# Altium footprint library Library.PcbLib: 144 footprints (part 2 of 9)
Each footprint in its own frame and in the unit in brackets; x right, y up, seen from the top. Pads: shape width x height; smd on the part's side, far side on the other; paste and mask are expansions set on the pad; w line width, h text height; cw(c..) or ccw(c..) is an arc to the next point about the centre after c.
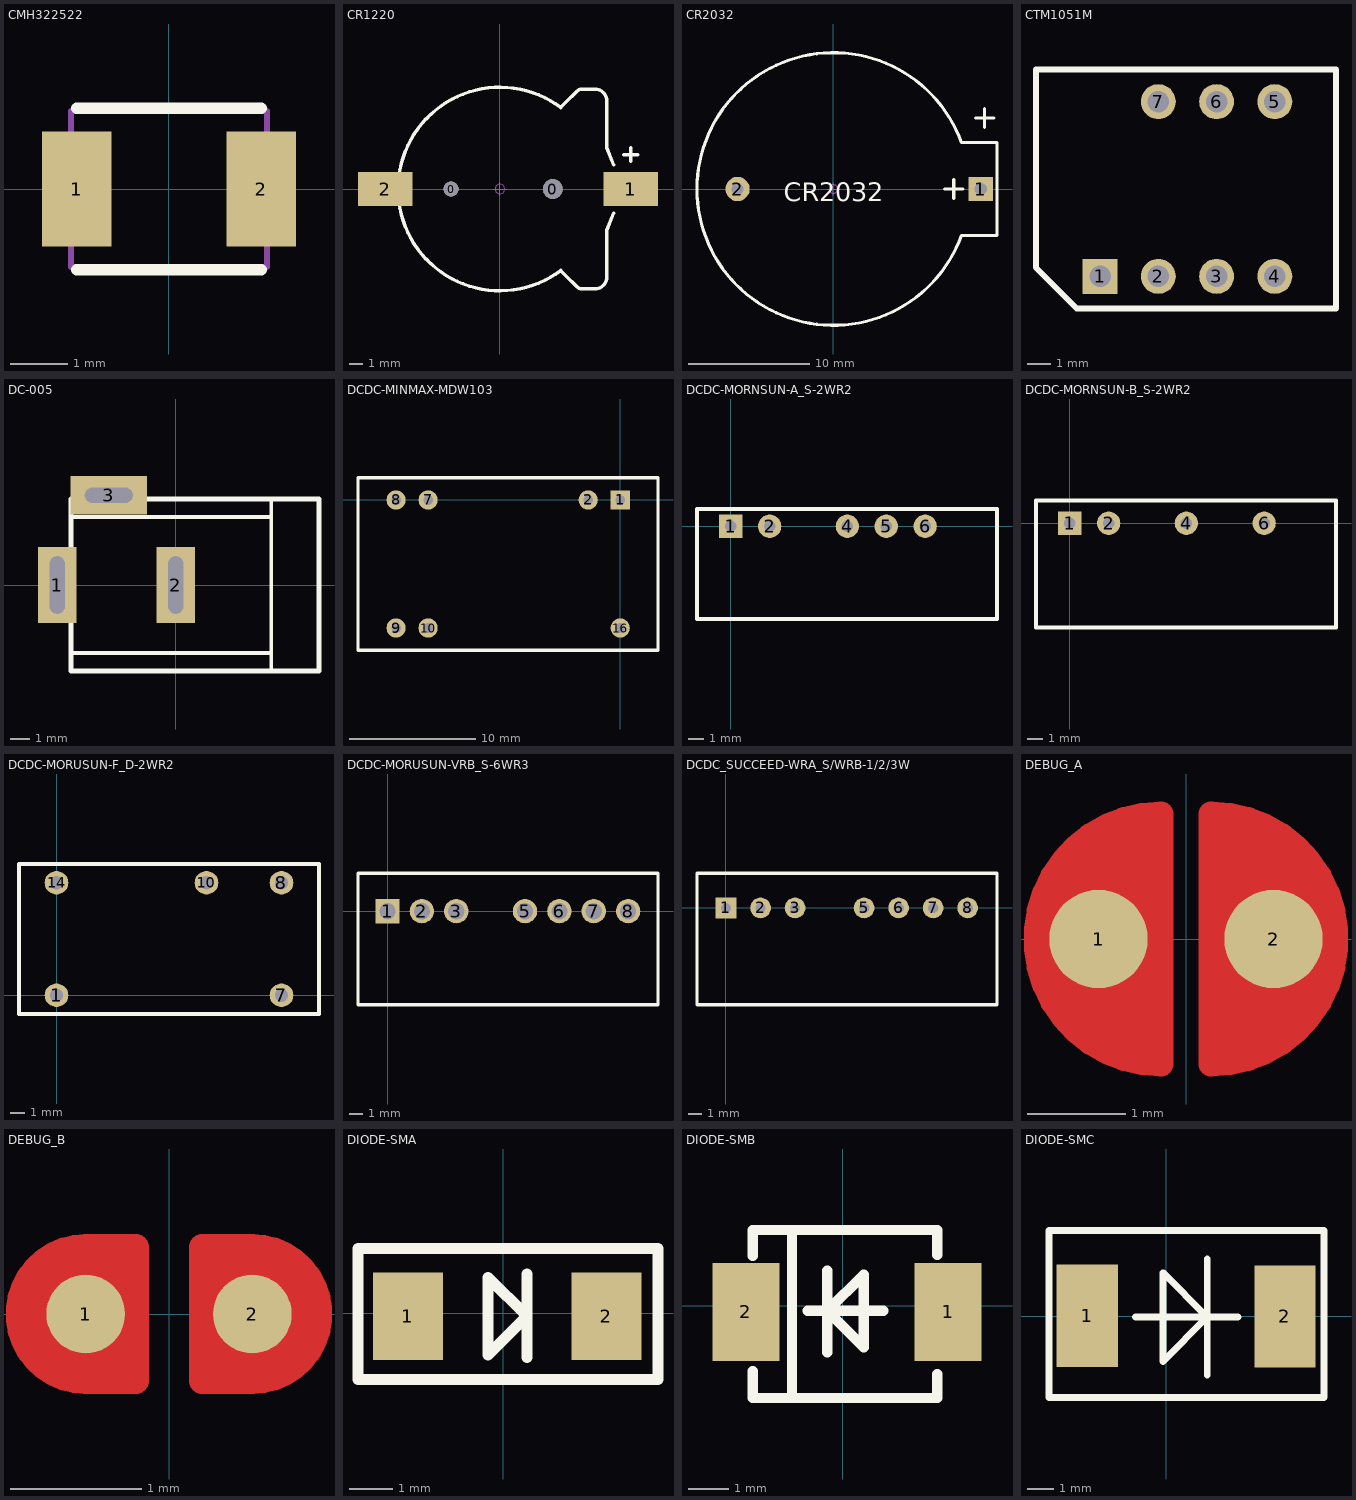
[diagram p1: the footprints below, top view; thin cyan lines are the x and y axes]

## CMH322522 [mm]
pads (2):
  rect 1.2x2 smd: 1(-1.6,0) 2(1.6,0)
Top Overlay:
  lines w0.2: -1.6,-1.4 1.6,-1.4 ; -1.6,1.4 1.6,1.4
Mechanical 5:
  lines w0.1: -1.7,-1.35 -1.7,1.35 1.7,1.35 1.7,-1.35 -1.7,-1.35
3D body: height 2.4, standoff 0, extent -1.699,-1.349 1.699,1.349

## CR1220 [mm] "纽扣电池座"
pads (4):
  round 1.1 hole 1.1: 0(-3.6,0)
  round 1.45 hole 1.45: 0(3.9,0)
  rect 4x2.5 smd: 1(9.652,0) 2(-8.458,0)
Top Overlay:
  lines w0.254: 4.5,-6 cw(c0,0) 4.5,6 ; 4.572,-6.096 4.826,-6.35 5.662,-7.186 ccw(c6.096,-6.753) 6.096,-7.366 7.007,-7.366 ccw(c7.007,-6.499) 7.874,-6.499 7.874,-3.048 8.382,-1.778 ; 4.572,6.096 4.826,6.35 5.662,7.186 cw(c6.096,6.753) 6.096,7.366 7.007,7.366 cw(c7.007,6.499) 7.874,6.499 7.874,3.048 8.382,1.778 ; 9.144,2.54 10.16,2.54 ; 9.652,2.032 9.652,3.048
Mechanical 15:
  circle w0.05: c0,0 r0.35
  lines w0.05: -0.5,0 0.5,0 ; 0,-0.5 0,0.5
3D body "CR1220_B.STEP": height 4.05, standoff -0.85, extent -9.416,-7.45 10.34,7.45

## CR2032 [mm] "纽扣电池座"
pads (2):
  rect 2x2 hole 1: 1(12.126,0)
  round 2 hole 1: 2(-7.874,0)
Top Overlay:
  lines w0.254: 9.144,0 10.668,0 ; 9.906,-0.762 9.906,0.762 ; 11.684,5.842 13.208,5.842 ; 12.446,5.08 12.446,6.604 ; 10.541,-3.81 cw(c0,0) 10.541,3.81 13.462,3.81 13.462,-3.81 10.541,-3.81
  text "CR2032" at -4.064,-1.016 h1.52
Mechanical 15:
  circle w0.05: c0,0 r0.35
  lines w0.05: -0.5,0 0.5,0 ; 0,-0.5 0,0.5
3D body "CR2032_B.STEP": height 8.75, standoff -3.05, extent -11.1,-11.099 13.3,11.099

## CTM1051M [mil]
pads (7):
  rect 60x60 hole 37: 1(510,175)
  round 60 hole 37: 2(610,175) 3(710,175) 4(810,175) 5(810,475) 6(710,475) 7(610,475)
Top Overlay:
  lines w10: 400,190 400,530 915,530 915,120 470,120 400,190
3D body "User Library-CTM1051M.STEP": height 303.15, standoff -157.48, extent 407.03,125.43 910.97,527

## DC-005 [mm] "5.5*2.1mm，DC30V,2.5A"
pads (3):
  rect 2x4 hole 0.8 slot 3 at 90 deg: 1(-6.2,0) 2(0,0)
  rect 4x2 hole 0.8 slot 2.5 at 0 deg: 3(-3.5,4.7)
Top Overlay:
  lines w0.2: -5.484,-3.556 5,-3.556 ; -5.484,3.556 5,3.556 ; 5,-4.5 5,4.5
  lines w0.254: -5.484,-4.5 -5.484,4.5 7.5,4.5 7.5,-4.5 -5.484,-4.5
3D body "dc-005.STEP": height 11.2, standoff -3.8, extent -6.55,-4.5 7.5,4.8

## DCDC-MINMAX-MDW103 [mil]
pads (7):
  rect 60x60 hole 30: 1(0,0)
  round 60 hole 30: 2(-100,0) 7(-600,0) 8(-700,0) 9(-700,-400) 10(-600,-400) 16(0,-400)
Top Overlay:
  lines w10: -818.9,-469.69 -818.9,69.69 118.11,69.69 118.11,-469.69 -818.9,-469.69

## DCDC-MORNSUN-A_S-2WR2 [mil]
pads (5):
  rect 60x60 hole 30: 1(0,0)
  round 60 hole 30: 2(100,0) 4(300,0) 5(400,0) 6(500,0)
Top Overlay:
  lines w10: -87,-239 -87,45 -29,45 685,45 685,-239 -87,-239
3D body "A_S-2WR2.stp": height 400, standoff -161.42, extent -87,-241.56 686.62,36

## DCDC-MORNSUN-B_S-2WR2 [mil]
pads (4):
  rect 60x60 hole 30: 1(0,0)
  round 60 hole 30: 2(100,0) 4(300,0) 6(500,0)
Top Overlay:
  lines w10: -87.01,-268 -87.01,58 -42,58 685.04,58 685.04,-268 -42.41,-268 -87.01,-268

## DCDC-MORUSUN-F_D-2WR2 [mm]
pads (5):
  round 1.6 hole 0.9: 1(0,0) 7(15.24,0) 8(15.24,7.62) 10(10.16,7.62) 14(0,7.62)
Top Overlay:
  lines w0.254: -2.54,-1.27 -0.635,-1.27 17.145,-1.27 17.78,-1.27 17.78,8.89 -2.54,8.89 -2.54,-1.27

## DCDC-MORUSUN-VRB_S-6WR3 [mm]
pads (7):
  rect 1.8x1.8 hole 1.2: 1(0,0)
  round 1.8 hole 1.2: 2(2.54,0) 3(5.08,0) 5(10.16,0) 6(12.7,0) 7(15.24,0) 8(17.78,0)
Top Overlay:
  lines w0.254: -2.184,-6.909 19.99,-6.909 19.99,2.794 -2.184,2.794 -2.184,-6.909
3D body "VRB_S-6WR3.stp": height 12, standoff -4.1, extent -2.11,-6.782 19.89,2.718

## DCDC_SUCCEED-WRA_S/WRB-1/2/3W [mil]
pads (7):
  rect 60x60 hole 30: 1(0,0)
  round 60 hole 30: 2(100,0) 3(200,0) 5(400,0) 6(500,0) 7(600,0) 8(700,0)
Top Overlay:
  lines w10: -84,-280 785,-280 785,100 -84,100 -84,-280
3D body "WRA_S-3WR2.stp": height 472.44, standoff -161.42, extent -82,-278.01 784.14,96.01

## DEBUG_A [mm] "调试断点焊盘"
pads (2):
  round 1 smd paste-1: 1(-0.889,0) 2(0.889,0)
Top Layer:
  region: -0.254,1.27 -0.254,-1.27 -0.762,-1.143 -1.397,-0.508 -1.524,0.254 -1.27,0.762 -1.016,1.016 -0.508,1.27
  region: 0.254,1.27 0.254,-1.27 0.762,-1.143 1.397,-0.508 1.524,0.254 1.27,0.762 1.016,1.016 0.508,1.27
  lines w0.254: -0.254,-1.27 cw(c-0.254,0) -0.254,1.27 -0.254,-1.27 ; 0.254,-1.27 ccw(c0.254,0) 0.254,1.27 0.254,-1.27
Top Solder:
  region: 0.254,1.27 0.254,-1.27 0.762,-1.143 1.397,-0.508 1.524,0.254 1.27,0.762 1.016,1.016 0.508,1.27
  region: -0.254,1.27 -0.254,-1.27 -0.762,-1.143 -1.397,-0.508 -1.524,0.254 -1.27,0.762 -1.016,1.016 -0.508,1.27
  lines w0.254: -0.254,-1.27 cw(c-0.254,0) -0.254,1.27 -0.254,-1.27 ; 0.254,-1.27 ccw(c0.254,0) 0.254,1.27 0.254,-1.27

## DEBUG_B [mm] "调试断点焊盘"
pads (2):
  round 0.6 smd paste-0.6: 1(-0.635,0) 2(0.635,0)
Top Layer:
  region: 0.254,-0.508 0.762,-0.508 0.838,-0.508 0.978,-0.45 1.085,-0.343 1.143,-0.203 1.143,-0.127 1.143,0 1.143,0.101 1.066,0.288 0.923,0.431 0.736,0.508 0.635,0.508 0.254,0.508
  region: -0.254,0.508 -0.762,0.508 -0.838,0.508 -0.978,0.45 -1.085,0.343 -1.143,0.203 -1.143,0.127 -1.143,0 -1.143,-0.101 -1.066,-0.288 -0.923,-0.431 -0.736,-0.508 -0.635,-0.508 -0.254,-0.508
  lines w0.203: -0.635,-0.508 cw(c-0.635,0) -0.635,0.508 -0.254,0.508 -0.254,-0.508 -0.635,-0.508 ; 0.254,-0.508 0.254,0.508 0.635,0.508 cw(c0.635,0) 0.635,-0.508 0.254,-0.508
Top Solder:
  region: 0.254,-0.508 0.635,-0.508 0.736,-0.508 0.923,-0.431 1.066,-0.288 1.143,-0.101 1.143,0 1.143,0.101 1.066,0.288 0.923,0.431 0.736,0.508 0.635,0.508 0.254,0.508
  region: -0.254,0.508 -0.635,0.508 -0.736,0.508 -0.923,0.431 -1.066,0.288 -1.143,0.101 -1.143,0 -1.143,-0.101 -1.066,-0.288 -0.923,-0.431 -0.736,-0.508 -0.635,-0.508 -0.254,-0.508
  lines w0.203: -0.635,-0.508 cw(c-0.635,0) -0.635,0.508 -0.254,0.508 -0.254,-0.508 -0.635,-0.508 ; 0.254,-0.508 0.635,-0.508 ccw(c0.635,0) 0.635,0.508 0.254,0.508 0.254,-0.508

## DIODE-SMA [mm] "贴片二极管"
height 2.54
pads (2):
  rect 1.6x2 smd: 1(-2.176,-0.072) 2(2.359,-0.072)
Top Overlay:
  lines w0.254: 0.542,-1.012 0.542,0.893 ; -3.319,-1.52 -3.319,1.478 3.539,1.478 3.539,-1.52 -3.319,-1.52 ; -0.347,-0.961 -0.347,0.817 0.542,-0.072 -0.347,-0.961
3D body "DO-214AC.STEP": height 2.4, standoff 0, extent -2.165,-1.396 2.435,1.304

## DIODE-SMB [mm]
height 2.54
pads (2):
  rect 1.65x2.4 smd: 1(2.576,-0.155) 2(-2.374,-0.155)
Top Overlay:
  lines w0.254: -2.211,-1.603 -2.211,-2.263 2.31,-2.263 2.31,-1.679 ; -2.211,1.216 -2.211,1.851 2.31,1.851 2.31,1.242 ; -1.246,-2.187 -1.246,1.851 ; -0.865,-0.13 0.99,-0.13 ; -0.382,-1.146 -0.382,0.861 ; -0.382,-0.13 0.507,0.759 0.507,-1.019 -0.382,-0.13
3D body "DI-214AA(SMB).step": height 2.45, standoff 0.03, extent -2.649,-2.131 2.851,1.769

## DIODE-SMC [mil] "贴片二极管"
height 59.06
pads (2):
  rect 90x149.84 smd: 1(-116.17,1.01)
  rect 90x149.63 smd: 2(173.83,0.01)
Top Overlay:
  lines w10: -45.17,-0.99 104.83,-0.99 ; 59.83,-85.99 59.83,84.01 ; -172.17,-118.99 230.83,-118.99 230.83,126.01 -172.17,126.01 -172.17,-118.99 ; -5.17,-65.99 -5.17,64.01 59.83,-0.99 -5.17,-65.99
3D body "DO-214AB.STEP": height 106.3, standoff 0, extent -131.01,-116.09 188.68,128.01